# Altium footprint library Special.PcbLib: 38 footprints (part 1 of 3)
Each footprint in its own frame and in the unit in brackets; x right, y up, seen from the top. Pads: shape width x height; smd on the part's side, far side on the other; paste and mask are expansions set on the pad; w line width, h text height; cw(c..) or ccw(c..) is an arc to the next point about the centre after c.
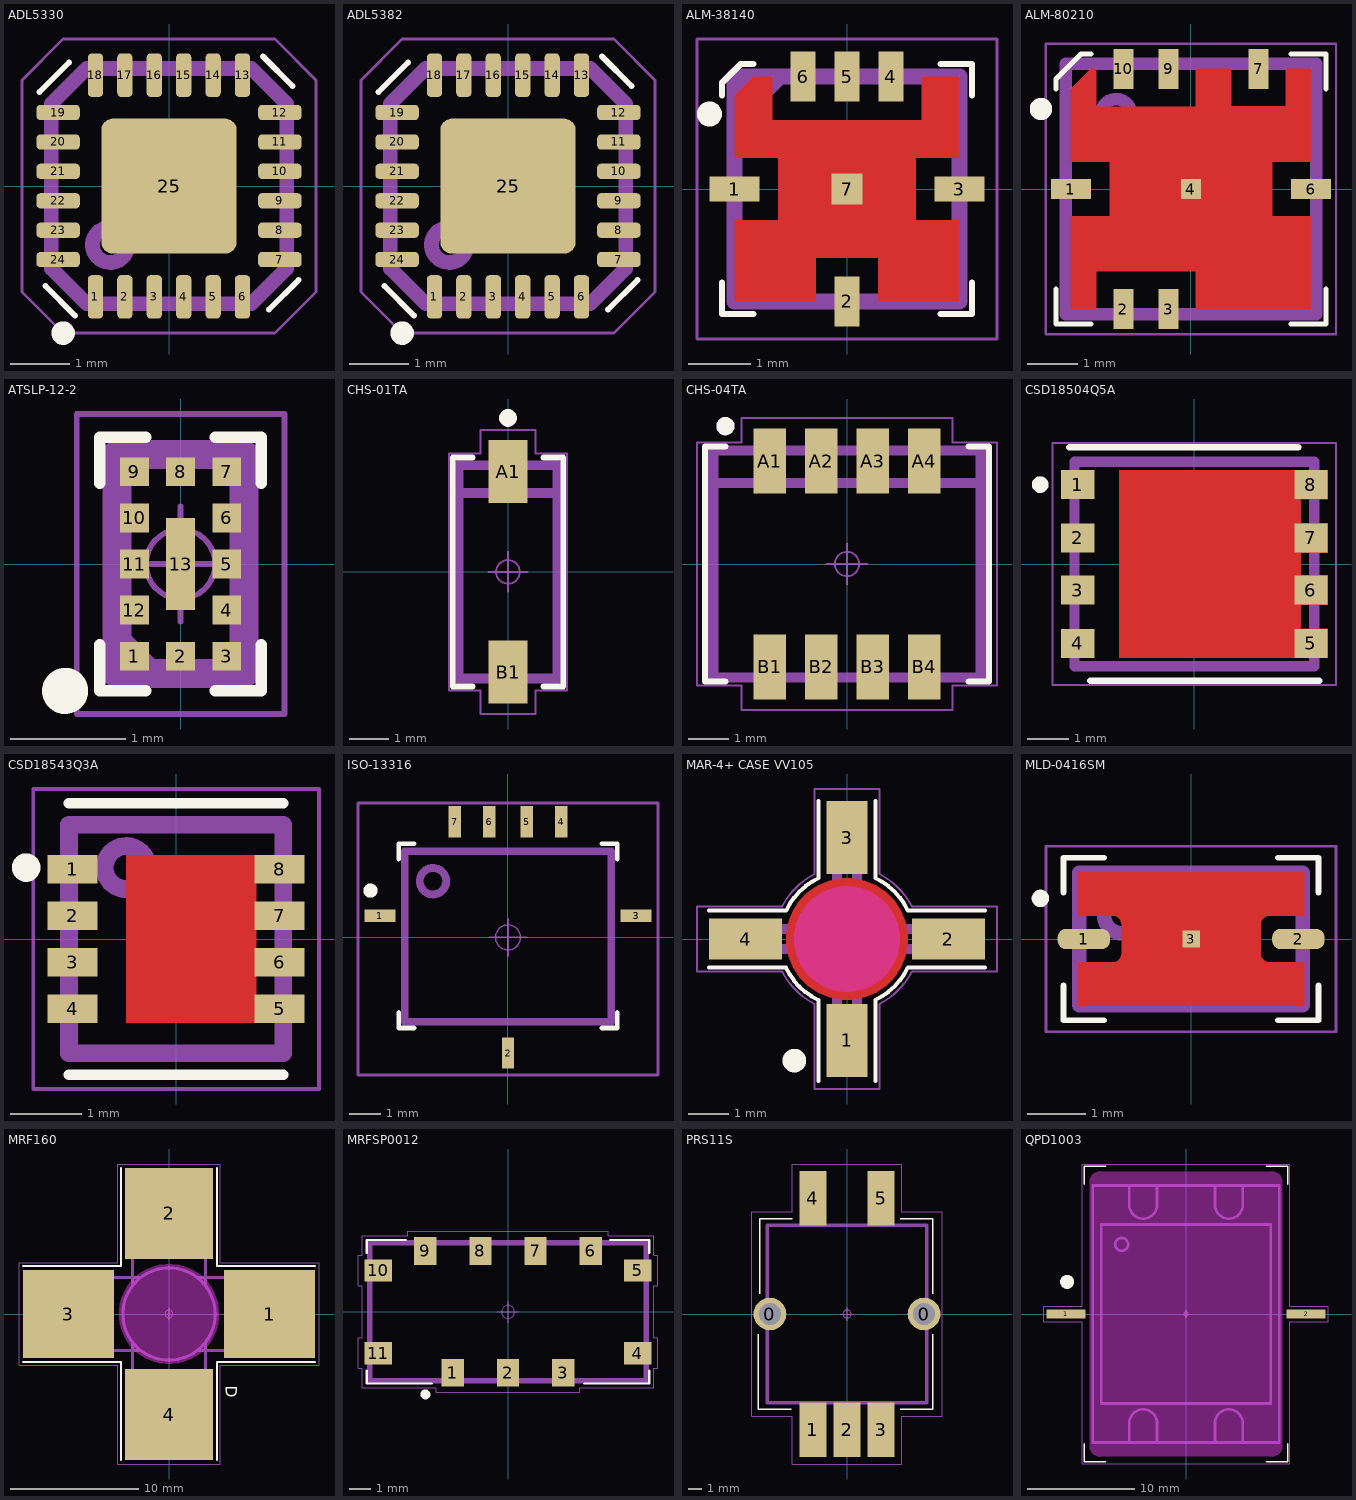
[diagram p0: the footprints below, top view; thin cyan lines are the x and y axes]

## ADL5330 [mm] "AD 24-Lead Lead Frame Chip Scale Package  [LFCSP_VQ] 4 mm ? 4 mm Body, Very Thin Quad  (CP-24-2)"
height 1
pads (25):
  rrect54% 0.26x0.74 smd: 1(-1.25,-1.885) 2(-0.75,-1.885) 3(-0.25,-1.885) 4(0.25,-1.885) 5(0.75,-1.885) 6(1.25,-1.885) 13(1.25,1.885) 14(0.75,1.885) 15(0.25,1.885) 16(-0.25,1.885) 17(-0.75,1.885) 18(-1.25,1.885)
  rrect54% 0.74x0.26 smd: 7(1.885,-1.25) 8(1.885,-0.75) 9(1.885,-0.25) 10(1.885,0.25) 11(1.885,0.75) 12(1.885,1.25) 19(-1.885,1.25) 20(-1.885,0.75) 21(-1.885,0.25) 22(-1.885,-0.25) 23(-1.885,-0.75) 24(-1.885,-1.25)
  rrect17% 2.3x2.3 smd paste-2.3: 25(0,0)
Top Overlay:
  circle w0.2: c-1.8,-2.5 r0.1
  lines w0.1: -2.2,1.6 -1.7,2.1 ; -2.1,-1.7 -1.6,-2.2 ; 1.6,2.2 2.1,1.7 ; 1.7,-2.1 2.2,-1.6
Top Paste:
  region: -0.11,0.11 -0.92,0.11 -0.92,0.92 -0.11,0.92
  region: -0.11,-0.92 -0.92,-0.92 -0.92,-0.11 -0.11,-0.11
  region: 0.92,0.11 0.11,0.11 0.11,0.92 0.92,0.92
  region: 0.92,-0.92 0.11,-0.92 0.11,-0.11 0.92,-0.11
Top Assembly:
  circle w0.25: c-1,-1 r0.3
  lines w0.25: -2,-1.4 -2,1.4 -1.4,2 1.4,2 2,1.4 2,-1.4 1.4,-2 -1.4,-2 -2,-1.4
  text ".Designator" at -1.8,-0.4 h1.5
Top Courtyard:
  circle w0.05: c0,0 r0.25
  lines w0.05: -0.35,0 0.35,0 ; 0,-0.35 0,0.35 ; -2.5,-1.8 -2.5,1.8 -1.8,2.5 1.8,2.5 2.5,1.8 2.5,-1.8 1.8,-2.5 -1.8,-2.5 -2.5,-1.8
3D body "ADL5330.STEP": height 1, standoff 0, extent -2,-2 2,2

## ADL5382 [mm] "AD 24-Lead Lead Frame Chip Scale Package  [LFCSP_VQ] 4 mm ? 4 mm Body, Very Thin Quad  (CP-24-2)"
height 1
pads (25):
  rrect54% 0.26x0.74 smd: 1(-1.25,-1.885) 2(-0.75,-1.885) 3(-0.25,-1.885) 4(0.25,-1.885) 5(0.75,-1.885) 6(1.25,-1.885) 13(1.25,1.885) 14(0.75,1.885) 15(0.25,1.885) 16(-0.25,1.885) 17(-0.75,1.885) 18(-1.25,1.885)
  rrect54% 0.74x0.26 smd: 7(1.885,-1.25) 8(1.885,-0.75) 9(1.885,-0.25) 10(1.885,0.25) 11(1.885,0.75) 12(1.885,1.25) 19(-1.885,1.25) 20(-1.885,0.75) 21(-1.885,0.25) 22(-1.885,-0.25) 23(-1.885,-0.75) 24(-1.885,-1.25)
  rrect17% 2.3x2.3 smd paste-2.3: 25(0,0)
Top Overlay:
  circle w0.2: c-1.8,-2.5 r0.1
  lines w0.1: -2.2,1.6 -1.7,2.1 ; -2.1,-1.7 -1.6,-2.2 ; 1.6,2.2 2.1,1.7 ; 1.7,-2.1 2.2,-1.6
Top Paste:
  region: 0.92,-0.92 0.11,-0.92 0.11,-0.11 0.92,-0.11
  region: 0.92,0.11 0.11,0.11 0.11,0.92 0.92,0.92
  region: -0.11,-0.92 -0.92,-0.92 -0.92,-0.11 -0.11,-0.11
  region: -0.11,0.11 -0.92,0.11 -0.92,0.92 -0.11,0.92
Top Assembly:
  circle w0.25: c-1,-1 r0.3
  lines w0.25: -2,-1.4 -1.4,-2 1.4,-2 2,-1.4 2,1.4 1.4,2 -1.4,2 -2,1.4 -2,-1.4
  text ".Designator" at -1.8,-0.4 h1.5
Top Courtyard:
  circle w0.05: c0,0 r0.25
  lines w0.05: -0.35,0 0.35,0 ; 0,-0.35 0,0.35 ; -2.5,-1.8 -1.8,-2.5 1.8,-2.5 2.5,-1.8 2.5,1.8 1.8,2.5 -1.8,2.5 -2.5,1.8 -2.5,-1.8
3D body "ADL5382.STEP": height 1, standoff 0, extent -2,-2 2,2

## ALM-38140 [mm] "AVAGO ALM-38140"
height 1.1
pads (7):
  rect 0.8x0.4 smd: 1(-1.8,0) 3(1.8,0)
  rect 0.4x0.8 smd: 2(0,-1.8) 4(0.7,1.8) 5(0,1.8) 6(-0.7,1.8)
  rect 0.5x0.5 smd: 7(0,0)
Top Layer:
  region: -1.8,-1.8 -1.8,-0.5 -1.1,-0.5 -1.1,0.5 -1.8,0.5 -1.8,1.5 -1.5,1.8 -1.2,1.8 -1.2,1.1 1.2,1.1 1.2,1.8 1.8,1.8 1.8,0.5 1.1,0.5 1.1,-0.5 1.8,-0.5 1.8,-1.8 0.5,-1.8 0.5,-1.1 -0.5,-1.1 -0.5,-1.8
Top Overlay:
  circle w0.2: c-2.2,1.2 r0.1
  lines w0.1: -2,-1.5 -2,-2 -1.5,-2 ; -2,1.5 -2,1.7 -1.7,2 -1.5,2 ; 1.5,-2 2,-2 2,-1.5 ; 1.5,2 2,2 2,1.5
Top Assembly:
  region: -1.8,1.8 -0.9,1.8 -1.8,0.9
  lines w0.25: -1.8,-1.8 -1.8,1.8 1.8,1.8 1.8,-1.8 -1.8,-1.8
  text ".Designator" at -1.6,-0.4 h1.5
Top Courtyard:
  circle w0.05: c0,0 r0.3
  lines w0.05: -0.5,0 0.5,0 ; 0,-0.5 0,0.5 ; -2.4,-2.4 2.4,-2.4 2.4,2.4 -2.4,2.4 -2.4,-2.4
3D body "ALM-38140.STEP": height 1.1, standoff -0.02, extent -1.9,-1.9 1.9,1.9

## ALM-80210 [mm] "AVAGO ALM-80210"
height 0.95
pads (8):
  rect 0.8x0.4 smd: 1(-2.4,0) 6(2.4,0)
  rect 0.4x0.8 smd: 2(-1.35,-2.4) 3(-0.45,-2.4) 7(1.35,2.4) 9(-0.45,2.4) 10(-1.35,2.4)
  rect 0.4x0.4 smd: 4(0,0)
Top Layer:
  region: -2.4,-2.4 -1.9,-2.4 -1.9,-1.65 0.1,-1.65 0.1,-2.4 2.4,-2.4 2.4,-0.55 1.625,-0.55 1.625,0.55 2.4,0.55 2.4,2.4 1.9,2.4 1.9,1.65 0.8,1.65 0.8,2.4 0.1,2.4 0.1,1.65 -1.9,1.65 -1.9,2.4 -2,2.4 -2.4,2 -2.4,0.55 -1.625,0.55 -1.625,-0.55 -2.4,-0.55
Top Overlay:
  circle w0.25: c-3,1.6 r0.1
  lines w0.1: -2.7,-2 -2.7,-2.7 -2,-2.7 ; -2.7,2 -2.7,2.2 -2.2,2.7 -2,2.7 ; 2,-2.7 2.7,-2.7 2.7,-2 ; 2,2.7 2.7,2.7 2.7,2
Top Assembly:
  circle w0.25: c-1.5,1.5 r0.3
  lines w0.25: -2.5,-2.5 2.5,-2.5 2.5,2.5 -2.5,2.5 -2.5,-2.5
  text ".Designator" at -2.2,-0.4 h1.5
Top Courtyard:
  circle w0.05: c0,0 r0.3
  lines w0.05: -0.7,0 0.7,0 ; 0,-0.7 0,0.7 ; -2.9,-2.9 2.9,-2.9 2.9,2.9 -2.9,2.9 -2.9,-2.9
3D body: height 1.1, standoff 0.05, extent -2.5,-2.5 2.5,2.5

## ATSLP-12-2 [mm] "Infineon case ATSLP-12-2"
height 0.65
pads (13):
  rect 0.25x0.25 smd: 1(-0.4,-0.8) 2(0,-0.8) 3(0.4,-0.8) 4(0.4,-0.4) 5(0.4,0) 6(0.4,0.4) 7(0.4,0.8) 8(0,0.8) 9(-0.4,0.8) 10(-0.4,0.4) 11(-0.4,0) 12(-0.4,-0.4)
  rect 0.25x0.8 smd: 13(0,0)
Top Overlay:
  circle w0.2: c-1,-1.1 r0.1
  lines w0.1: -0.7,-0.7 -0.7,-1.1 -0.3,-1.1 ; -0.7,0.7 -0.7,1.1 -0.3,1.1 ; 0.3,-1.1 0.7,-1.1 0.7,-0.7 ; 0.3,1.1 0.7,1.1 0.7,0.7
Top Assembly:
  region: -0.55,-0.95 -0.55,-0.5 -0.1,-0.95
  lines w0.25: -0.55,-0.95 -0.55,0.95 0.55,0.95 0.55,-0.95 -0.55,-0.95
  text ".Designator" at -1.1,-1.7 h1.5
Top Courtyard:
  circle w0.05: c0,0 r0.3
  lines w0.05: -0.5,0 0.5,0 ; 0,-0.5 0,0.5 ; -0.9,-1.3 0.9,-1.3 0.9,1.3 -0.9,1.3 -0.9,-1.3
3D body "CASE ATSLP-12-2.STEP": height 0.65, standoff 0, extent -0.55,-0.95 0.55,0.95

## CHS-01TA [mm] "Nicel Copal Electronics Low Profile"
height 2.5
pads (2):
  rect 1x1.6 smd: A1(0,2.54) B1(0,-2.54)
Top Overlay:
  circle w0.25: c0,3.9 r0.1
  lines w0.15: -0.9,-2.9 -1.4,-2.9 -1.4,2.9 -0.9,2.9 ; 0.9,-2.9 1.4,-2.9 1.4,2.9 0.9,2.9
Top Assembly:
  lines w0.25: -1.25,2 1.25,2 ; -1.25,-2.7 1.25,-2.7 1.25,2.7 -1.25,2.7 -1.25,-2.7
  text ".Designator" at 0.5,-2.3 h1.5
Top Courtyard:
  circle w0.05: c0,0 r0.3
  lines w0.05: -0.5,0 0.5,0 ; 0,-0.5 0,0.5 ; -1.5,-3 -1.5,3 -0.7,3 -0.7,3.6 0.7,3.6 0.7,3 1.5,3 1.5,-3 0.7,-3 0.7,-3.6 -0.7,-3.6 -0.7,-3 -1.5,-3
3D body "CHS_01TA.STEP": height 2.52, standoff 0, extent -1.25,-2.8 1.25,2.8

## CHS-04TA [mm] "Nicel Copal Electronics Low Profile"
height 2.5
pads (8):
  rect 0.8x1.6 smd: A1(-1.905,2.54) A2(-0.635,2.54) A3(0.635,2.54) A4(1.905,2.54) B1(-1.905,-2.54) B2(-0.635,-2.54) B3(0.635,-2.54) B4(1.905,-2.54)
Top Overlay:
  circle w0.25: c-3,3.4 r0.1
  lines w0.15: -3,-2.9 -3.5,-2.9 -3.5,2.9 -3,2.9 ; 3,-2.9 3.5,-2.9 3.5,2.9 3,2.9
Top Assembly:
  lines w0.25: -3.3,2 3.3,2 ; -3.3,-2.8 -3.3,2.8 3.3,2.8 3.3,-2.8 -3.3,-2.8
  text ".Designator" at -3,-0.7 h1.5
Top Courtyard:
  circle w0.05: c0,0 r0.3
  lines w0.05: -0.5,0 0.5,0 ; 0,-0.5 0,0.5 ; -3.7,-3 -2.6,-3 -2.6,-3.6 2.6,-3.6 2.6,-3 3.7,-3 3.7,3 2.6,3 2.6,3.6 -2.6,3.6 -2.6,3 -3.7,3 -3.7,-3
3D body "CHS-04TA.stp": height 2.52, standoff 0, extent -3.3,-2.8 3.3,2.8

## CSD18504Q5A [mm] "Texus Instruments Q5A Package"
height 1.1
pads (8):
  rect 0.8x0.7 smd: 1(-2.8,1.905) 2(-2.8,0.625) 3(-2.8,-0.625) 4(-2.8,-1.905) 5(2.8,-1.905) 6(2.8,-0.625) 7(2.8,0.625) 8(2.8,1.905)
Top Layer:
  region: 3.2,-2.25 -1.8,-2.25 -1.8,2.25 3.2,2.25 3.2,1.55 2.55,1.55 2.55,0.975 3.2,0.975 3.2,0.275 2.55,0.275 2.55,-0.275 3.2,-0.275 3.2,-0.975 2.55,-0.975 2.55,-1.55 3.2,-1.55
Top Overlay:
  circle w0.2: c-3.7,1.905 r0.1
  lines w0.15: -3,2.8 2.5,2.8 ; -2.5,-2.8 3,-2.8
Top Assembly:
  lines w0.25: -2.875,-2.45 -2.875,2.45 2.875,2.45 2.875,-2.45 -2.875,-2.45
  text ".Designator" at -2.4,-0.464 h1.5
Top Courtyard:
  circle w0.05: c0,0 r0.3
  lines w0.05: -0.5,0 0.5,0 ; 0,-0.5 0,0.5 ; -3.4,-2.9 3.4,-2.9 3.4,2.9 -3.4,2.9 -3.4,-2.9
3D body "CSD18504Q5A.STEP": height 1.1, standoff 0, extent -3.005,-2.45 3.005,2.45

## CSD18543Q3A [mm] "Texas Instruments Q3A Package"
pads (8):
  rect 0.7x0.4 smd: 1(-1.45,0.975) 2(-1.45,0.325) 3(-1.45,-0.325) 4(-1.45,-0.975) 5(1.45,-0.975) 6(1.45,-0.325) 7(1.45,0.325) 8(1.45,0.975)
Top Layer:
  region: 1.125,1.175 -0.7,1.175 -0.7,-1.175 1.125,-1.175
Top Overlay:
  circle w0.2: c-2.1,1 r0.1
  lines w0.15: -1.5,-1.9 1.5,-1.9 ; -1.5,1.9 1.5,1.9
Top Assembly:
  circle w0.25: c-0.7,1 r0.3
  lines w0.25: -1.5,-1.6 1.5,-1.6 1.5,1.6 -1.5,1.6 -1.5,-1.6
  text ".Designator" at -1,-0.464 h1.5
Top Courtyard:
  circle w0.05: c0,0 r0.3
  lines w0.05: -0.5,0 0.5,0 ; 0,-0.5 0,0.5 ; -2,-2.1 2,-2.1 2,2.1 -2,2.1 -2,-2.1
3D body "CSD18543Q3A.STEP": height 0.9, standoff 0, extent -1.65,-1.75 1.65,1.75

## ISO-13316 [mm]
pads (7):
  rect 1x0.4 smd: 1(-4.1,0.7) 3(4.1,0.7)
  rect 0.4x1 smd: 2(0,-3.7) 4(1.7,3.7) 5(0.6,3.7) 6(-0.6,3.7) 7(-1.7,3.7)
Top Overlay:
  circle w0.25: c-4.4,1.5 r0.1
  lines w0.15: -3.5,-2.4 -3.5,-2.9 -3,-2.9 ; -3.5,2.5 -3.5,3 -3,3 ; 3,-2.9 3.5,-2.9 3.5,-2.4 ; 3,3 3.5,3 3.5,2.5
Top Assembly:
  circle w0.25: c-2.4,1.8 r0.424
  lines w0.25: -3.302,-2.7 -3.302,2.761 3.302,2.761 3.302,-2.7 -3.302,-2.7
  text ".Designator" at -2.8,-0.7 h1.5
Top Courtyard:
  circle w0.05: c0,0 r0.4
  lines w0.05: -0.6,0 0.6,0 ; 0,-0.6 0,0.6
  lines w0.1: -4.8,-4.4 -4.8,4.3 4.8,4.3 4.8,-4.4 -4.8,-4.4
3D body "ISO13316.STEP": height 1.6, standoff -0.05, extent -4.313,-3.637 4.303,3.843

## MAR-4+ CASE VV105 [mm] "Mini-Circuits CASE VV105"
height 1
pads (4):
  rect 1x1.8 smd: 1(0,-2.5) 3(0,2.5)
  rect 1.8x1 smd: 2(2.5,0) 4(-2.5,0)
Top Layer:
  pour cut-out: 0,-1.5 -0.148,-1.5 -0.438,-1.442 -0.711,-1.329 -0.956,-1.165 -1.165,-0.956 -1.329,-0.711 -1.442,-0.438 -1.5,-0.148 -1.5,0 -1.5,0.148 -1.442,0.438 -1.329,0.711 -1.165,0.956 -0.956,1.165 -0.711,1.329 -0.438,1.442 -0.148,1.5 0,1.5 0.148,1.5 0.438,1.442 0.711,1.329 0.956,1.165 1.165,0.956 1.329,0.711 1.442,0.438 1.5,0.148 1.5,0 1.5,-0.148 1.442,-0.438 1.329,-0.711 1.165,-0.956 0.956,-1.165 0.711,-1.329 0.438,-1.442 0.148,-1.5
Top Overlay:
  circle w0.3: c-1.3,-3 r0.141
  lines w0.1: -3.4,-0.7 -1.508,-0.7 ; -3.4,0.7 -1.5,0.7 cw(c0,0) -0.7,1.5 -0.7,3.4 ; -1.508,-0.704 ccw(c0,0) -0.704,-1.508 ; -0.7,-3.5 -0.7,-1.508 ; 0.7,-3.5 0.7,-1.5 ccw(c0,0) 1.5,-0.7 3.4,-0.7 ; 0.7,3.4 0.7,1.5 cw(c0,0) 1.5,0.7 3.4,0.7
Keep-Out Layer:
  board cut-out: 0,-1.3 -0.128,-1.3 -0.379,-1.25 -0.616,-1.152 -0.829,-1.01 -1.01,-0.829 -1.152,-0.616 -1.25,-0.379 -1.3,-0.128 -1.3,0 -1.3,0.128 -1.25,0.379 -1.152,0.616 -1.01,0.829 -0.829,1.01 -0.616,1.152 -0.379,1.25 -0.128,1.3 0,1.3 0.128,1.3 0.379,1.25 0.616,1.152 0.829,1.01 1.01,0.829 1.152,0.616 1.25,0.379 1.3,0.128 1.3,0 1.3,-0.128 1.25,-0.379 1.152,-0.616 1.01,-0.829 0.829,-1.01 0.616,-1.152 0.379,-1.25 0.128,-1.3
Top Assembly:
  circle w0.25: c0,0 r1.1
  circle w0.25: c0,-0.75 r0.1
  lines w0.25: -1.075,-0.25 -3.2,-0.25 -3.2,0.25 -1.075,0.25 ; -0.25,-1.075 -0.25,-2.7 0.25,-3.2 0.25,-1.075 ; -0.25,1.075 -0.25,3.2 0.25,3.2 0.25,1.075 ; 1.075,-0.25 3.2,-0.25 3.2,0.25 1.075,0.25
  text ".Designator" at 0.9,1.3 h1.5
Top Courtyard:
  lines w0.05: -3.7,-0.8 -3.7,0.8 -1.6,0.8 cw(c0,0) -0.8,1.6 -0.8,3.7 0.8,3.7 0.8,1.6 cw(c0,0) 1.6,0.8 3.7,0.8 3.7,-0.8 1.6,-0.8 cw(c0,0) 0.8,-1.6 0.8,-3.7 -0.8,-3.7 -0.8,-1.6 cw(c0,0) -1.6,-0.8 -3.7,-0.8
3D body "MAR-4+ CASE VV105.STEP": height 1, standoff -0.5, extent -3.15,-3.15 3.15,3.15

## MLD-0416SM [mm] "Marki SMT (0.152” x 0.090” x 0.045”)"
height 1.27
pads (3):
  rrect80% 0.9x0.35 smd: 1(-1.85,0) 2(1.85,0)
  rect 0.3x0.3 smd: 3(0,0)
Top Layer:
  region: -1.95,-1.15 1.95,-1.15 1.95,-0.4 1.35,-0.4 1.321,-0.397 1.267,-0.375 1.225,-0.333 1.203,-0.279 1.2,-0.25 1.2,0.25 1.203,0.279 1.225,0.333 1.267,0.375 1.321,0.397 1.35,0.4 1.95,0.4 1.95,1.15 -1.95,1.15 -1.95,0.4 -1.35,0.4 -1.321,0.397 -1.267,0.375 -1.225,0.333 -1.203,0.279 -1.2,0.25 -1.2,-0.25 -1.203,-0.279 -1.225,-0.333 -1.267,-0.375 -1.321,-0.397 -1.35,-0.4 -1.95,-0.4
Top Overlay:
  circle w0.15: c-2.6,0.7 r0.075
  lines w0.1: -2.2,-0.8 -2.2,-1.4 -1.5,-1.4 ; -2.2,0.8 -2.2,1.4 -1.5,1.4 ; 1.5,-1.4 2.2,-1.4 2.2,-0.8 ; 1.5,1.4 2.2,1.4 2.2,0.8
Top Assembly:
  circle w0.25: c-1.2,0.4 r0.3
  lines w0.25: -1.93,-1.145 -1.93,1.145 1.93,1.145 1.93,-1.145 -1.93,-1.145
  text ".Designator" at -2.2,1.6 h1.5
Top Courtyard:
  circle w0.05: c0,0 r0.3
  lines w0.05: -0.5,0 0.5,0 ; 0,-0.5 0,0.5 ; -2.5,-1.6 2.5,-1.6 2.5,1.6 -2.5,1.6 -2.5,-1.6
3D body "MLD-0416SM.STEP": height 1.27, standoff 0, extent -1.93,-1.145 1.93,1.145

## MRF160 [mm] "MACOM Power FET CASE 249-06"
height 1.8
pads (4):
  rect 7.1x6.9 smd: 1(7.85,0) 3(-7.85,0)
  rect 6.9x7.1 smd: 2(0,7.85) 4(0,-7.85)
Top Overlay:
  lines w0.15: -11.375,-3.75 -3.75,-3.75 -3.75,-11.375 ; -11.375,3.75 -3.75,3.75 -3.75,11.375 ; 3.75,-11.375 3.75,-3.75 11.375,-3.75 ; 3.75,11.375 3.75,3.75 11.375,3.75
  text "D" at 4.1,-5.6 h1.5
Keep-Out Layer:
  board cut-out: 0,-3.9 -0.256,-3.9 -0.762,-3.833 -1.256,-3.701 -1.729,-3.505 -2.171,-3.25 -2.577,-2.938 -2.938,-2.577 -3.25,-2.171 -3.505,-1.729 -3.701,-1.256 -3.833,-0.762 -3.9,-0.256 -3.9,0 -3.9,0.256 -3.833,0.762 -3.701,1.256 -3.505,1.729 -3.25,2.171 -2.938,2.577 -2.577,2.938 -2.171,3.25 -1.729,3.505 -1.256,3.701 -0.762,3.833 -0.256,3.9 0,3.9 0.256,3.9 0.762,3.833 1.256,3.701 1.729,3.505 2.171,3.25 2.577,2.938 2.938,2.577 3.25,2.171 3.505,1.729 3.701,1.256 3.833,0.762 3.9,0.256 3.9,0 3.9,-0.256 3.833,-0.762 3.701,-1.256 3.505,-1.729 3.25,-2.171 2.938,-2.577 2.577,-2.938 2.171,-3.25 1.729,-3.505 1.256,-3.701 0.762,-3.833 0.256,-3.9
Top Assembly:
  circle w0.25: c0,0 r3.6
  lines w0.25: -2.85,-2.199 -2.85,-11.05 2.85,-11.05 2.85,-2.199 ; -2.85,2.199 -2.85,11.05 2.85,11.05 2.85,2.199 ; -2.199,-2.85 -11.05,-2.85 -11.05,2.85 -2.199,2.85 ; 2.199,-2.85 11.05,-2.85 11.05,2.85 2.199,2.85
  text "D" at -0.3,-6.9 h1
Top Courtyard:
  circle w0.05: c0,0 r0.3
  lines w0.05: -0.5,0 0.5,0 ; 0,-0.5 0,0.5 ; -11.7,-4 -4,-4 -4,-11.7 4,-11.7 4,-4 11.7,-4 11.7,4 4,4 4,11.7 -4,11.7 -4,4 -11.7,4 -11.7,-4
3D body "CASE 249-06 ISSUE H.STEP": height 1.92, standoff -1.53, extent -11.05,-11.05 11.05,11.05

## MRFSP0012 [mm] "MRFSP0012 Packadge S25"
height 1.8
pads (11):
  rect 1.02x1.27 smd: 1(-2.54,-2.8) 2(0,-2.8) 3(2.54,-2.8) 6(3.81,2.8) 7(1.27,2.8) 8(-1.27,2.8) 9(-3.81,2.8)
  rect 1.27x1.02 smd: 4(5.97,-1.905) 5(5.97,1.905) 10(-5.97,1.905) 11(-5.97,-1.905)
Top Overlay:
  circle w0.25: c-3.8,-3.8 r0.1
  lines w0.1: -6.5,-2.7 -6.5,-3.3 -3.5,-3.3 ; -6.5,2.7 -6.5,3.3 -4.7,3.3 ; 3.5,-3.3 6.5,-3.3 6.5,-2.7 ; 4.7,3.3 6.5,3.3 6.5,2.7
Top Assembly:
  lines w0.25: -6.35,-3.175 -6.35,3.175 6.35,3.175 6.35,-3.175 -6.35,-3.175
  text ".Designator" at -3.5,-0.3 h1.5
Top Courtyard:
  circle w0.05: c0,0 r0.3
  lines w0.05: -0.5,0 0.5,0 ; 0,-0.5 0,0.5 ; -6.9,-2.6 -6.9,-1.2 -6.7,-1.2 -6.7,1.2 -6.9,1.2 -6.9,2.6 -6.7,2.6 -6.7,3.5 -4.6,3.5 -4.6,3.7 4.6,3.7 4.6,3.5 6.7,3.5 6.7,2.6 6.9,2.6 6.9,1.2 6.7,1.2 6.7,-1.2 6.9,-1.2 6.9,-2.6 6.7,-2.6 6.7,-3.5 3.3,-3.5 3.3,-3.7 -3.3,-3.7 -3.3,-3.5 -6.7,-3.5 -6.7,-2.6 -6.9,-2.6
3D body "MRFSP0012.STEP": height 1.78, standoff 0, extent -6.35,-3.175 6.35,3.175

## PRS11S [mm] "PRS11S - 11 mm SMD Potentiometer"
height 20
pads (7):
  round 2.4 hole 1.6 unplated: 0(-5.65,0) 0(5.65,0)
  rect 2x4 smd: 1(-2.5,-8.5) 2(0,-8.5) 3(2.5,-8.5) 4(-2.5,8.5) 5(2.5,8.5)
Top Overlay:
  lines w0.1: -6.5,-1.5 -6.5,-7 -4.1,-7 ; -6.4,1.5 -6.4,7 -4,7 ; 3.9,-7 6.3,-7 6.3,-1.5 ; 3.9,7 6.3,7 6.3,1.5
Top Assembly:
  lines w0.25: -5.85,-6.5 5.85,-6.5 5.85,6.5 -5.85,6.5 -5.85,-6.5
  text ".Designator" at -3.3,-0.4 h1.5
Top Courtyard:
  circle w0.05: c0,0 r0.3
  lines w0.05: -0.5,0 0.5,0 ; 0,-0.5 0,0.5 ; -7,-7.5 -7,7.5 -4,7.5 -4,11 4,11 4,7.5 7,7.5 7,-7.5 4,-7.5 4,-11 -4,-11 -4,-7.5 -7,-7.5
3D body "PRS11S-11mm.STEP": height 20, standoff -1.4, extent -5.85,-9.5 5.85,9

## QPD1003 [mm] "Qorvo Flange RF-565"
height 1.9
pads (2):
  rect 3.6x0.8 smd: 1(-11.2,0) 2(11.2,0)
Top Overlay:
  circle w0.9: c-11.1,3 r0.2
  lines w0.15: -9.5,-12.1 -9.5,-13.8 -7.5,-13.8 ; -9.5,12.1 -9.5,13.8 -7.5,13.8 ; 7.5,-13.8 9.5,-13.8 9.5,-12.1 ; 7.5,13.8 9.5,13.8 9.5,12.1
Keep-Out Layer:
  board cut-out: -9,-12.3 -9,12.3 -9,12.398 -8.962,12.592 -8.886,12.774 -8.777,12.937 -8.637,13.077 -8.474,13.186 -8.292,13.262 -8.098,13.3 -8,13.3 8,13.3 8.098,13.3 8.292,13.262 8.474,13.186 8.637,13.077 8.777,12.937 8.886,12.774 8.962,12.592 9,12.398 9,12.3 9,-12.3 9,-12.398 8.962,-12.592 8.886,-12.774 8.777,-12.937 8.637,-13.077 8.474,-13.186 8.292,-13.262 8.098,-13.3 8,-13.3 -8,-13.3 -8.098,-13.3 -8.292,-13.262 -8.474,-13.186 -8.637,-13.077 -8.777,-12.937 -8.886,-12.774 -8.962,-12.592 -9,-12.398
Top Assembly:
  circle w0.25: c-6,6.5 r0.6
  lines w0.25: -5.3,-12 -5.3,-10.2 cw(c-4,-10.2) -2.7,-10.2 -2.7,-12 ; -5.3,12 -5.3,10.2 ccw(c-4,10.2) -2.7,10.2 -2.7,12 ; 2.7,-12 2.7,-10.2 cw(c4,-10.2) 5.3,-10.2 5.3,-12 ; 2.7,12 2.7,10.2 ccw(c4,10.2) 5.3,10.2 5.3,12 ; -8.7,-12 8.7,-12 8.7,12 -8.7,12 -8.7,-12 ; -7.9,-8.35 7.9,-8.35 7.9,8.35 -7.9,8.35 -7.9,-8.35
  text ".Designator" at -3.3,-0.2 h1.5
Top Courtyard:
  circle w0.05: c0,0 r0.2
  lines w0.05: -0.35,0 0.35,0 ; 0,-0.35 0,0.35 ; -13.3,-0.7 -9.7,-0.7 -9.7,-14 9.7,-14 9.7,-0.7 13.3,-0.7 13.3,0.7 9.7,0.7 9.7,14 -9.7,14 -9.7,0.7 -13.3,0.7 -13.3,-0.7
3D body "QPD1003.SLDPRT": height 2, standoff -2.4, extent -12.2,-12 12.2,12